# Altium footprint library tsl_Pcblib.PcbLib: 219 footprints (part 4 of 14)
Each footprint in its own frame and in the unit in brackets; x right, y up, seen from the top. Pads: shape width x height; smd on the part's side, far side on the other; paste and mask are expansions set on the pad; w line width, h text height; cw(c..) or ccw(c..) is an arc to the next point about the centre after c.
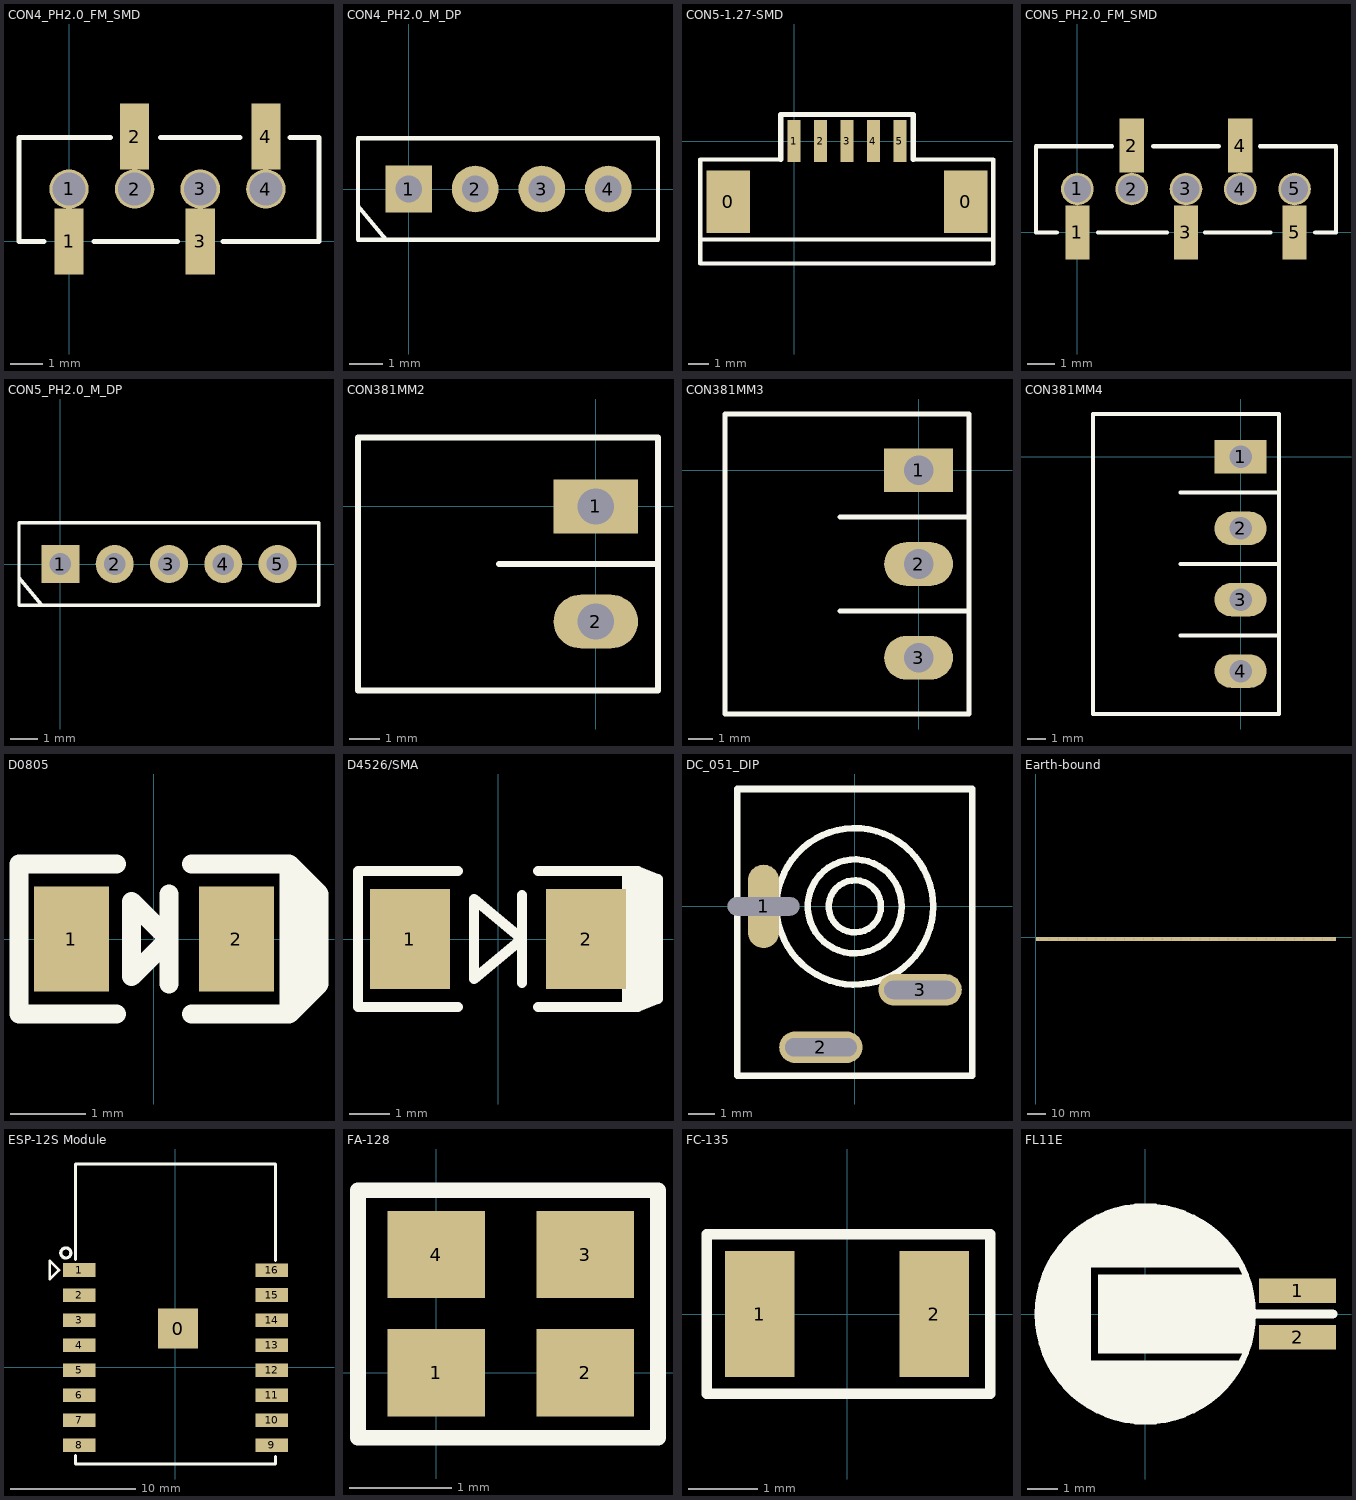
[diagram p3: the footprints below, top view; thin cyan lines are the x and y axes]

## CON4_PH2.0_FM_SMD [mm]
pads (8):
  rect 0.89x2 smd: 1(0,0) 2(2,3.2) 3(4,0) 4(6,3.2)
  round 1.2 hole 1: 1(0,1.6) 2(2,1.6) 3(4,1.6) 4(6,1.6)
Top Overlay:
  lines w0.152: -0.762,0 -1.524,0 -1.524,3.175 1.27,3.175 ; 0.762,0 3.302,0 ; 2.794,3.175 5.207,3.175 ; 4.699,0 7.62,0 7.62,3.175 6.731,3.175

## CON4_PH2.0_M_DP [mm]
pads (4):
  rect 1.4x1.4 hole 0.8: 1(0,0)
  round 1.4 hole 0.8: 2(2,0) 3(4,0) 4(6,0)
Top Overlay:
  lines w0.127: -1.524,-0.508 -0.712,-1.482 ; -1.524,-1.524 -1.524,1.524 7.493,1.524 7.493,-1.524 -1.524,-1.524

## CON5-1.27-SMD [mm]
height 4
pads (7):
  rect 2.1x3 smd: 0(-3.15,-2.9) 0(8.23,-2.9)
  rect 0.635x2 smd: 1(0,0) 2(1.27,0) 3(2.54,0) 4(3.81,0) 5(5.08,0)
Top Overlay:
  lines w0.203: -4.496,-4.724 9.55,-4.724 ; -0.635,-0.889 -4.496,-0.889 -4.496,-4.572 -4.496,-5.867 9.55,-5.867 9.55,-4.572 9.55,-0.889 5.715,-0.889
  lines w0.254: -0.635,-0.889 -0.635,1.27 5.715,1.27 5.715,-0.889

## CON5_PH2.0_FM_SMD [mm]
pads (10):
  rect 0.89x2 smd: 1(0,0) 2(2,3.2) 3(4,0) 4(6,3.2) 5(8,0)
  round 1.2 hole 1: 1(0,1.6) 2(2,1.6) 3(4,1.6) 4(6,1.6) 5(8,1.6)
Top Overlay:
  lines w0.152: -0.762,0 -1.524,0 -1.524,3.175 1.27,3.175 ; 0.762,0 3.302,0 ; 2.794,3.175 5.207,3.175 ; 4.699,0 7.112,0 ; 6.731,3.175 9.525,3.175 9.525,0 8.763,0

## CON5_PH2.0_M_DP [mm]
pads (5):
  rect 1.4x1.4 hole 0.8: 1(0,0)
  round 1.4 hole 0.8: 2(2,0) 3(4,0) 4(6,0) 5(8,0)
Top Overlay:
  lines w0.127: -1.524,-0.508 -0.712,-1.482 ; 9.524,-1.524 9.524,1.524 ; 9.525,-1.524 -1.524,-1.524 -1.524,1.524 9.525,1.524

## CON381MM2 [mil]
height 994.09
pads (2):
  rect 110x70 hole 47.24: 1(0,0)
  oval 110x70 hole 47.24: 2(0,-150)
Top Overlay:
  lines w8: -126,-75 81,-75 ; -310,-240 81,-240 81,90 -310,90 -310,-240
3D body "2 way cable mount screw terminal,3.81mm.stp": height 279.53, standoff -157.48, extent -980,-240.55 -346.14,90.55
3D body "2way horizontal PCB header,3.81mm pitch.stp": height 285.43, standoff -133.86, extent -316.14,-252.36 50,102.36

## CON381MM3 [mil]
height 994.09
pads (3):
  rect 110x70 hole 47.24: 1(0,0)
  oval 110x70 hole 47.24: 2(0,-150) 3(0,-300)
Top Overlay:
  lines w8: -126,-225 81,-225 ; -126,-75 81,-75 ; -310,-390 -310,90 81,90 81,-390 -310,-390
3D body "3 way cable mount screw terminal,3.81mm.stp": height 279.53, standoff -157.48, extent -1005,-390.55 -371.14,90.55
3D body "3 way horizontal PCB header,3.81mm pitch.stp": height 285.43, standoff -133.86, extent -316.14,-402.36 50,102.36

## CON381MM4 [mil]
height 994.09
pads (4):
  rect 110x70 hole 47.24: 1(0,0)
  oval 110x70 hole 47.24: 2(0,-150) 3(0,-300) 4(0,-450)
Top Overlay:
  lines w8: -126,-375 81,-375 ; 81,-390 81,90 -310,90 -310,-540 81,-540 81,75 ; -126,-225 81,-225 -126,-225 ; -126,-75 81,-75 -126,-75
3D body "4 way cable mount screw terminal,3.81mm.stp": height 279.53, standoff -157.48, extent -1010,-545.55 -376.14,85.55
3D body "2way horizontal PCB header,3.81mm pitch.stp": height 285.43, standoff -133.86, extent -316.14,-252.36 50,102.36
3D body "2way horizontal PCB header,3.81mm pitch.stp": height 285.43, standoff -133.86, extent -316.14,-552.36 50,-197.64

## D0805 [mm]
pads (2):
  rect 1x1.4 smd: 1(-1.1,0) 2(1.1,0)
Top Overlay:
  lines w0.254: -0.5,-1 -1.8,-1 -1.8,1 -0.5,1 ; 0.2,-0.6 0.2,0.6 ; 0.5,-1 1.8,-1 ; 0.5,1 1.8,1 ; 2,-0.8 2,0.8 ; 1.8,-1 1.8,1 ; 1.8,-1 2.2,-0.6 2.2,0.6 1.8,1 ; -0.3,-0.5 0.2,0 -0.3,0.5 -0.3,-0.5
3D body "User Library-led_0805.step": height 1.1, standoff 0, extent -1.01,-0.625 1.01,0.625

## D4526/SMA [mm]
pads (2):
  rect 2x2.5 smd: 1(-2.2,0) 2(2.2,0)
Top Overlay:
  lines w0.254: -1,-1.7 -3.5,-1.7 -3.5,1.7 -1,1.7 ; 0.6,-1.1 0.6,1.1 ; 1,-1.7 3.5,-1.7 ; 1,1.7 3.5,1.7 ; 3.5,-1.7 4,-1.5 4,1.5 3.5,1.7 ; 3.5,-1.7 3.5,1.7 ; -0.6,-1 0.6,0 -0.6,1 -0.6,-1
  lines w0.3: 3.25,-1.6 3.25,1.6 ; 3.75,-1.5 3.75,1.5

## DC_051_DIP [mm]
pads (3):
  oval 1.2x3.2 / inner oval 1.2x3.2 / far side oval 2x4 hole 0.7 slot 2.75 at 0 deg: 1(-3.5,0)
  oval 3.2x1.2 / inner oval 3.2x1.2 / far side oval 4x2 hole 0.7 slot 2.75 at 0 deg: 2(-1.3,-5.4) 3(2.5,-3.2)
Top Overlay:
  circle w0.25: c0,0 r1
  circle w0.25: c0,0 r1.8
  circle w0.25: c0,0 r3
  lines w0.25: -4.5,-6.5 -4.5,4.5 4.5,4.5 4.5,-6.5 -4.5,-6.5

## Earth-bound [mm]
pads (2):
  rect 159x2 smd: 1(79.502,-1.016)
  rect 159x2 smd far side: 1(79.502,-1.016)
via 126.905,-1.016 diameter 1.016 hole 0.508
via 131.905,-1.016 diameter 1.016 hole 0.508
via 141.905,-1.016 diameter 1.016 hole 0.508
via 136.905,-1.016 diameter 1.016 hole 0.508
via 156.905,-1.016 diameter 1.016 hole 0.508
via 151.905,-1.016 diameter 1.016 hole 0.508
via 146.905,-1.016 diameter 1.016 hole 0.508
via 86.905,-1.016 diameter 1.016 hole 0.508
via 91.905,-1.016 diameter 1.016 hole 0.508
via 101.905,-1.016 diameter 1.016 hole 0.508
via 96.905,-1.016 diameter 1.016 hole 0.508
via 116.905,-1.016 diameter 1.016 hole 0.508
via 121.905,-1.016 diameter 1.016 hole 0.508
via 111.905,-1.016 diameter 1.016 hole 0.508
via 106.905,-1.016 diameter 1.016 hole 0.508
via 46.905,-1.016 diameter 1.016 hole 0.508
via 51.905,-1.016 diameter 1.016 hole 0.508
via 61.905,-1.016 diameter 1.016 hole 0.508
via 56.905,-1.016 diameter 1.016 hole 0.508
via 76.905,-1.016 diameter 1.016 hole 0.508
via 81.905,-1.016 diameter 1.016 hole 0.508
via 71.905,-1.016 diameter 1.016 hole 0.508
via 66.905,-1.016 diameter 1.016 hole 0.508
via 26.905,-1.016 diameter 1.016 hole 0.508
via 31.905,-1.016 diameter 1.016 hole 0.508
via 41.905,-1.016 diameter 1.016 hole 0.508
via 36.905,-1.016 diameter 1.016 hole 0.508
via 16.905,-1.016 diameter 1.016 hole 0.508
via 21.905,-1.016 diameter 1.016 hole 0.508
via 11.905,-1.016 diameter 1.016 hole 0.508
via 6.905,-1.016 diameter 1.016 hole 0.508
via 1.905,-1.016 diameter 1.016 hole 0.508

## ESP-12S Module [mm]
pads (17):
  rect 3.2x3.2 smd: 0(0.22,3.092)
  rect 2.6x1.1 smd: 1(-7.7,7.775) 2(-7.7,5.762) 3(-7.7,3.775) 4(-7.7,1.775) 5(-7.7,-0.225) 6(-7.7,-2.225) 7(-7.7,-4.225) 8(-7.7,-6.225) 9(7.7,-6.225) 10(7.7,-4.225) 11(7.7,-2.225) 12(7.7,-0.225) 13(7.7,1.775) 14(7.7,3.775) 15(7.7,5.775) 16(7.7,7.769)
Top Overlay:
  circle w0.254: c-8.763,9.144 r0.402
  lines w0.203: -10.033,7.048 -9.302,7.778 -10.033,8.509 -10.033,7.048
  lines w0.254: -8,-7.036 -8,-7.725 8,-7.725 8,-7.137 8.001,-7.137 ; -8,8.611 -8,16.256 8,16.256 8,8.56

## FA-128 [mm]
pads (4):
  rect 0.95x0.85 smd: 1(0,0) 2(1.45,0) 3(1.45,1.15) 4(0,1.15)
Top Overlay:
  lines w0.152: -0.762,-0.635 -0.762,1.778 2.159,1.778 2.159,-0.635 -0.762,-0.635

## FC-135 [mm]
pads (2):
  rect 1x1.8 smd: 1(-1.25,0) 2(1.25,0)
Top Overlay:
  lines w0.152: -2.012,-1.143 2.052,-1.143 2.052,1.143 -2.012,1.143 -2.012,-1.143

## FL11E [mm]
pads (2):
  rect 2.5x0.8 smd: 1(4.953,0.762) 2(4.953,-0.762)
Top Overlay:
  circle w0.203: c0,0 r3.5
  region: 3.302,1.27 3.429,0.635 3.5,0 3.429,-0.762 3.302,-1.27 -1.524,-1.27 -1.524,1.27
  region: -3.175,1.524 -3.429,0.762 -3.556,-0.127 -3.429,-0.889 -3.175,-1.397 -3.048,-1.587 -1.778,-1.651 -1.778,1.651
  region: -3.048,-1.524 -3.048,-1.651 -3.029,-1.681 -2.995,-1.743 -2.963,-1.807 -2.934,-1.872 -2.921,-1.905 -2.904,-1.919 -2.87,-1.95 -2.839,-1.981 -2.808,-2.015 -2.794,-2.032 -2.773,-2.061 -2.735,-2.121 -2.703,-2.185 -2.677,-2.252 -2.667,-2.286 -1.905,-2.921 -1.143,-3.302 -0.127,-3.556 0.762,-3.429 1.524,-3.175 2.286,-2.667 2.921,-1.905 3.175,-1.524
  region: 3.048,1.524 3.048,1.651 3.029,1.681 2.995,1.743 2.963,1.807 2.934,1.872 2.921,1.905 2.904,1.919 2.87,1.95 2.839,1.981 2.808,2.015 2.794,2.032 2.773,2.061 2.735,2.121 2.703,2.185 2.677,2.252 2.667,2.286 1.905,2.921 1.143,3.302 0.127,3.556 -0.762,3.429 -1.524,3.175 -2.286,2.667 -2.921,1.905 -3.175,1.524
  lines w0.3: 3.5,0 6.096,0